# Altium footprint library XU-GENARAL PCB .PcbLib: 1176 footprints (part 50 of 75)
Each footprint in its own frame and in the unit in brackets; x right, y up, seen from the top. Pads: shape width x height; smd on the part's side, far side on the other; paste and mask are expansions set on the pad; w line width, h text height; cw(c..) or ccw(c..) is an arc to the next point about the centre after c.
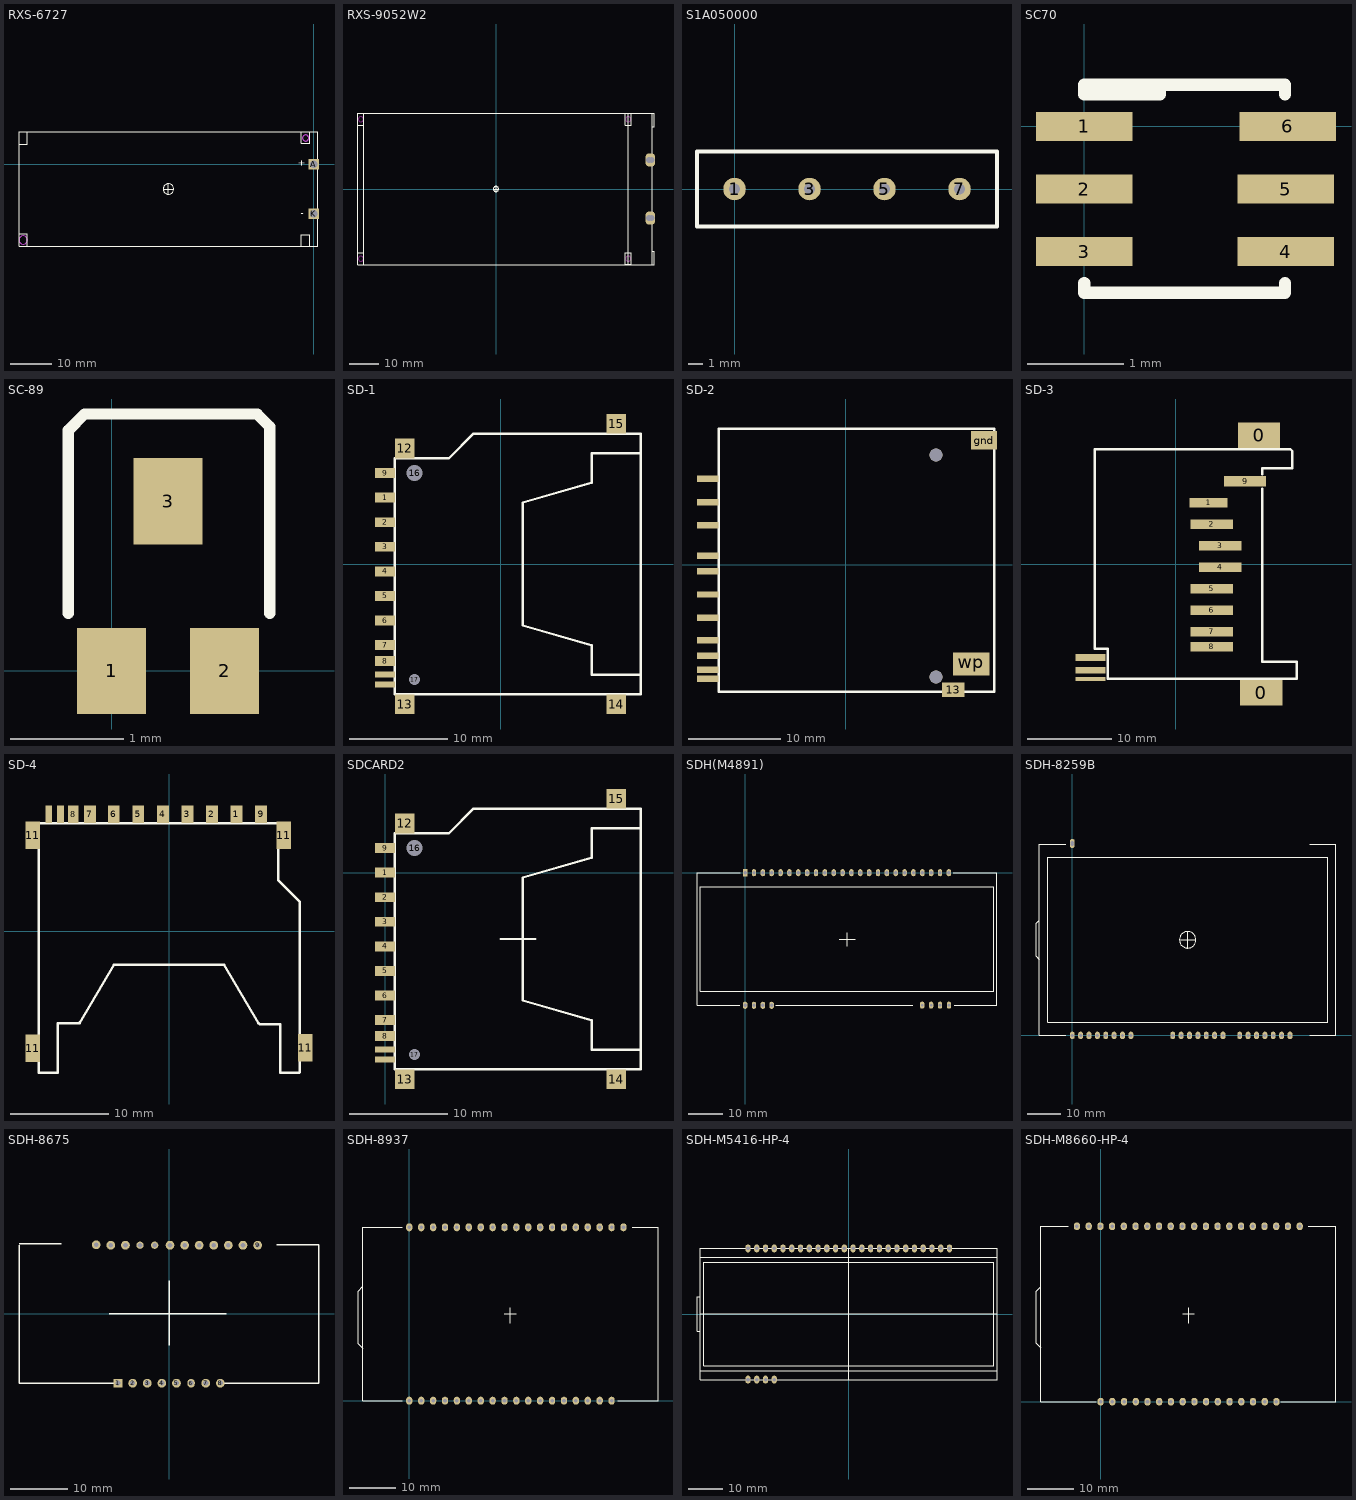
[diagram p49: the footprints below, top view; thin cyan lines are the x and y axes]

## RXS-6727 [mm]
pads (2):
  rect 2.5x2.5 hole 1.85: A(0,0) K(0,-12)
Top Overlay:
  circle w0.127: c-35.2,-6 r1.27
  lines w0.127: -71.4,-16.85 -69.4,-16.85 -69.4,-19.85 ; -71.4,4.85 -69.4,4.85 -69.4,7.85 ; -36.47,-6 -35.2,-6 ; -35.2,-7.27 -35.2,-6 ; -35.2,-4.73 -35.2,-6 ; -33.93,-6 -35.2,-6 ; -3,-19.85 -3,-17.05 -1,-17.05 -1,-19.85 ; -3,7.85 -3,5.05 -1,5.05 -1,7.85 ; -71.4,-19.85 -71.4,7.85 1,7.85 1,-19.85 -71.4,-19.85
  text "-" at -3.188,-12.604 h1.52
  text "+" at -2.172,-0.666 h1.52
Keep-Out Layer:
  circle w0.127: c-2,6.35 r0.75
  circle w0.127: c-70.4,-18.35 r1
Mechanical 1:
  circle w0.127: c-2,6.35 r0.75
  circle w0.127: c-70.4,-18.35 r1

## RXS-9052W2 [mm]
pads (4):
  oval 2.5x4.5 hole 2: A(52.7,-10) A(53.5,-10) K(52.7,10) K(53.5,10)
Top Overlay:
  circle w0.127: c0,0 r0.9
  lines w0.127: -47.5,-22 -45.5,-22 -45.5,-25.14 ; -47.5,22 -45.5,22 ; -45.5,22.86 -45.5,26 ; -1.016,0 0,0 ; 0,-1.016 0,0 ; 0,0.889 0,0 ; 1,0 0,0 ; 53.7,-21.4 54.5,-21.4 54.5,-26 53.7,-26 ; 53.7,21.4 54.5,21.4 54.5,26 53.7,26 ; -47.5,-26 -47.5,26 -45.5,26 ; -47.5,-26 -45.5,-26 ; -47.5,-26 -45.5,-26 ; -45.5,-26 -45.5,26 ; -45.5,-26 45.5,-26 ; -45.5,26 45.5,26 ; 45.5,-26 53.7,-26 ; 45.5,-26 45.5,26 ; 45.5,26 53.7,26 ; 53.7,-26 53.7,26 ; 44.484,-25.971 46.484,-25.971 46.484,-25.111 46.484,-21.971 44.484,-21.971 44.484,-25.971 ; 44.484,22 46.484,22 46.484,22.86 46.484,26 44.484,26 44.484,22
Keep-Out Layer:
  circle w0.1: c-46.5,24 r0.9
  circle w0.1: c-46.5,-24 r0.9
  circle w0.1: c45.5,24 r0.9
  circle w0.1: c45.5,-23.971 r0.9

## S1A050000 [mil]
pads (4):
  round 60 hole 30: 1(0,0) 3(200,0) 5(400,0) 7(600,0)
Top Overlay:
  lines w10: -100,-100 700,-100 700,100 -100,100 -100,-100

## SC70 [mm]
pads (6):
  rect 1x0.3 smd: 1(0,0) 2(0,-0.65) 3(0,-1.3) 4(2.092,-1.3) 5(2.092,-0.65) 6(2.112,0)
Top Overlay:
  lines w0.127: 0,-1.626 0,-1.727 2.083,-1.727 2.083,-1.626 ; 0.787,0.432 0.787,0.33 0,0.33 0,0.432 2.083,0.432 2.083,0.33

## SC-89 [mil]
pads (3):
  rect 24x30 smd: 1(0,0) 2(39.37,0) 3(19.68,59.05)
Top Overlay:
  lines w4: -15,20 -15,83.74 -9.37,89.37 50.63,89.37 55,85 55,20

## SD-1 [mm]
pads (17):
  rect 2x1 smd: 1(-11.75,6.75) 2(-11.75,4.25) 3(-11.75,1.75) 4(-11.75,-0.75) 5(-11.75,-3.25) 6(-11.75,-5.75) 7(-11.75,-8.25) 8(-11.75,-9.875) 9(-11.75,9.25)
  rect 2x0.6 smd: 10(-11.75,-12.25) 11(-11.75,-11.25)
  rect 2x2 smd: 12(-9.75,11.75) 13(-9.75,-14.25) 14(11.75,-14.25) 15(11.75,14.25)
  round 1.5 hole 1.6: 16(-8.75,9.25)
  round 1 hole 1.1: 17(-8.75,-11.75)
Top Overlay:
  lines w0.254: 14.25,-11.25 9.25,-11.25 9.25,-8.25 2.25,-6.25 2.25,6.25 9.25,8.25 9.25,11.25 14.25,11.25 ; -10.75,-13.25 -10.75,10.75 -5.25,10.75 -2.75,13.25 14.25,13.25 14.25,-13.25 -10.75,-13.25

## SD-2 [mm]
pads (14):
  rect 2.35x0.7 smd: 1(-14.935,6.8) 2(-14.935,4.3) 3(-14.935,1) 4(-14.935,-0.7) 5(-14.935,-3.2) 6(-14.935,-5.7) 7(-14.935,-8.13) 8(-14.935,-9.82) 9(-14.935,9.3) cd(-14.935,-11.32) com(-14.935,-12.32)
  rect 2.4x1.6 smd: 13(11.595,-13.5)
  rect 2.8x2 smd: gnd(14.935,13.5)
  rect 3.95x2.5 smd: wp(13.565,-10.7)
via 9.735,-12.1 diameter 1.4 hole 1.4
via 9.735,11.9 diameter 1.4 hole 1.4
Top Overlay:
  lines w0.254: -13.76,-13.72 -13.76,14.72 16.045,14.72 16.045,-13.72 -13.76,-13.72

## SD-3 [mm]
pads (14):
  rect 5x3 smd: 0(9.843,15.24) 0(10.097,-15.24)
  rect 4.5x1.143 smd: 1(3.874,7.239)
  rect 5x1.143 smd: 2(4.255,4.699) 3(5.271,2.159) 4(5.271,-0.381) 5(4.255,-2.921) 6(4.255,-5.461) 7(4.255,-8.001) 8(4.255,-9.779)
  rect 5x1.27 smd: 9(8.192,9.779)
  rect 3.556x0.8 smd: 10(-10.097,-11.049) 11(-10.097,-12.573)
  rect 3.556x0.5 smd: 12(-10.097,-13.589)
Top Overlay:
  lines w0.3: 7.683,-13.589 14.287,-13.589 14.287,-11.557 10.223,-11.557 10.223,8.889 ; 8.191,-13.589 -8.065,-13.589 -8.065,-10.033 -9.589,-10.033 -9.589,13.589 8.191,13.589 13.525,13.589 13.779,13.335 13.779,11.303 10.223,11.303 10.223,10.59

## SD-4 [mm]
pads (15):
  rect 1.2x1.8 smd: 1(6.858,11.917) 2(4.369,11.917) 3(1.875,11.908) 4(-0.625,11.908) 5(-3.125,11.908) 6(-5.625,11.908) 7(-8.05,11.908) 9(9.375,11.908)
  rect 1.1x1.8 smd: 8(-9.754,11.917)
  rect 0.7x1.8 smd: 10(-11.05,11.908) 12(-12.243,11.917)
  rect 1.5x2.8 smd: 11(-13.868,-11.917) 11(-13.868,9.774) 11(11.684,9.774) 11(13.868,-11.866)
Top Overlay:
  lines w0.254: -11.3,-9.383 -11.3,-14.383 -13.273,-14.383 -13.273,11.003 -13.259,11.017 11.1,11.017 11.1,5.207 13.289,3.018 13.3,3.018 13.3,-14.356 13.273,-14.383 11.3,-14.383 11.3,-9.484 9.258,-9.484 9.1,-9.326 ; -11.249,-9.377 -9.207,-9.377 -9.049,-9.219 ; -9.1,-9.377 -5.588,-3.383 ; -5.6,-3.383 5.6,-3.383 9.1,-9.377
Multi-Layer:
  circle w0.254: c-11.532,8.617 r0.58
  circle w0.254: c9.5,8.657 r0.82

## SDCARD2 [mm]
height 1.1
pads (17):
  rect 2x1 smd: 1(0,0) 2(0,-2.5) 3(0,-5) 4(0,-7.5) 5(0,-10) 6(0,-12.5) 7(0,-15) 8(0,-16.625) 9(0,2.5)
  rect 2x0.6 smd: 10(0,-19) 11(0,-18)
  rect 2x2 smd: 12(2,5) 13(2,-21) 14(23.5,-21) 15(23.5,7.5)
  round 1.5 hole 1.6: 16(3,2.5)
  round 1 hole 1.1: 17(3,-18.5)
Top Overlay:
  lines w0.2: 11.75,-6.75 15.306,-6.75
  lines w0.254: 26,-18 21,-18 21,-15 14,-13 14,-0.5 21,1.5 21,4.5 26,4.5 ; 1,-20 26,-20 26,6.5 9,6.5 6.5,4 1,4 1,-20

## SDH(M4891) [mil]
pads (32):
  rect 50x80 hole 38: 1(0,0)
  oval 50x80 hole 38: 2(100,0) 3(200,0) 4(300,0) 5(400,0) 6(500,0) 7(600,0) 8(700,0) 9(800,0) 10(900,0) 11(1000,0) 12(1100,0) 13(1200,0) 14(1300,0) 15(1400,0) 16(1500,0) 17(1600,0) 18(1700,0) 19(1800,0) 20(1900,0) 21(2000,0) 22(2100,0) 23(2200,0) 24(2300,0) 25(0,-1496) 26(100,-1496.06) 27(200,-1496.06) 28(300,-1496.06)
  oval 50x80 hole 30: 29(1998,-1495.03) 30(2099,-1495.03) 31(2200,-1495) 32(2301,-1495.03)
Top Overlay:
  lines w5: -59.06,-1496.06 -59,-1496 ; 4,-1339 4.42,-1338.58 ; 1065,-748.03 1150,-748.03 ; 1135,-748.03 1244,-748.03 ; 1150,-831.03 1150,-748.03 ; 1150,-676.03 1150,-748.03
  lines w10: -59.06,-1496.06 -542.91,-1496.06 -542.91,0 -53,0 ; 345.94,-1496.06 1889.76,-1496.06 ; 2347,0 2842.91,0 2842.91,-1496.06 2362.2,-1496.06 ; -503.54,-1338.58 -503.54,-157.48 2803.54,-157.48 2803.54,-1338.58 -503.54,-1338.58

## SDH-8259B [mil]
pads (26):
  oval 59.06x90 hole 40: 19(0,0) 20(100,0) 21(200,0) 22(300,0) 23(400,0) 24(500,0) 25(600,0) 26(700,0) 27(1200,0) 27(1200,0) 28(1300,0) 29(1400,0) 30(1500,0) 31(1600,0) 32(1700,0) 33(1800,0) 34(2000,0) 34(2000,0) 35(2100,0) 36(2200,0) 37(2300,0) 38(2400,0) 39(2500,0) 40(2600,0)
  oval 59.05x90 hole 40: 72(0,2283.47) 72(0,2303.15)
Top Overlay:
  circle w10: c1377.95,1141.73 r98.42
  lines w8: -393.7,905.51 -433.07,944.88 -433.07,1141.73 -433.07,1338.58 -393.7,1377.95 ; -78.74,0 -393.7,0 -393.7,2283.47 -78.74,2283.47 ; 1279.53,1141.73 1476.38,1141.73 ; 1377.95,1043.31 1377.95,1240.16 ; 2834.65,0 3149.61,0 3149.61,2283.47 2834.65,2283.47 ; -295.28,157.48 3051.18,157.48 3051.18,2125.98 -295.28,2125.98 -295.28,157.48

## SDH-8675 [mil]
pads (20):
  rect 60x60 hole 35: 1(-350.41,-475)
  round 60 hole 35: 2(-250.41,-475) 3(-150.41,-475) 4(-50.41,-475) 5(49.59,-475) 7(249.59,-475) 8(349.59,-475)
  oval 50x60 hole 35: 6(149.59,-475)
  round 60 hole 32: 9(604.41,468.28) 10(504.41,468.28) 11(404.41,468.28) 12(304.41,468.28) 13(204.41,468.28) 14(105.23,468.57) 15(5.23,468.57) 18(-299.59,468.57) 19(-399.59,468.57) 20(-499.59,471.29)
  round 50 hole 32: 16(-99.59,468.57) 17(-199.59,468.57)
Top Overlay:
  lines w10: -1027.37,-473.72 -1027.37,468.28 ; -1027.25,478.28 -737.59,478.28 ; -1026.09,-475 -350.41,-475 ; -410.41,-1.36 389.59,-1.36 ; -0.41,-215 -0.41,225 ; 349.59,-475 1022.91,-475 ; 736.41,470.28 1024.19,470.28 1024.19,-473.72

## SDH-8937 [mm]
pads (37):
  oval 1.35x1.7 hole 0.762: 1(0,0) 2(2.54,0) 3(5.08,0) 4(7.62,0) 5(10.16,0) 6(12.7,0) 7(15.24,0) 8(17.78,0) 9(20.32,0) 10(22.86,0) 11(25.4,0) 12(27.94,0) 13(30.48,0) 14(33.02,0) 15(35.56,0) 16(38.1,0) 17(40.64,0) 18(43.18,0) 19(45.72,37) 20(43.18,37) 21(40.64,37) 22(38.1,37) 23(35.56,37) 24(33.02,37) 25(30.48,37) 26(27.94,37) 27(25.4,37) 28(22.86,37) 29(20.32,37) 30(17.78,37) 31(15.24,37) 32(12.7,37) 33(10.16,37) 34(7.62,37) 35(5.08,37) 36(2.54,37) 37(0,37)
Top Overlay:
  lines w0.203: -9.952,11.2 -10.952,12.2 -10.952,23.376 -9.952,24.376 ; -1.46,0 -9.91,0 -9.91,37 -1.46,37 ; 20.32,18.5 22.86,18.5 ; 21.59,16.543 21.59,18.5 21.59,19.845 ; 44.54,0 53.09,0 53.09,37 47.54,37

## SDH-M5416-HP-4 [mil]
pads (28):
  oval 60x90 hole 40: 1(-1150.09,748.06) 2(-1050.09,748.06) 3(-950.09,748.06) 4(-850.09,748.06) 5(-750.09,748.06) 6(-650.09,748.06) 7(-550.09,748.06) 8(-450.09,748.06) 9(-350.09,748.06) 10(-250.09,748.06) 11(-150.09,748.06) 12(-50.09,748.06) 13(49.91,748.06) 14(149.91,748.06) 15(249.91,748.06) 16(349.91,748.06) 17(449.91,748.06) 18(549.91,748.06) 19(649.91,748.06) 20(749.91,748.06) 21(849.91,748.06) 22(949.91,748.06) 23(1049.91,748.06) 24(1149.91,748.06) 25(-1150.09,-748) 26(-1050.09,-747.92) 27(-950.09,-747.92) 28(-850.09,-747.92)
Top Overlay:
  lines w5: -1693,-196.82 -1732.37,-196.82 -1732.37,196.88 -1693,196.88 ; -1653.63,-590.52 1653.46,-590.52 1653.46,590.58 -1653.63,590.58 -1653.63,-590.52
  lines w10: -1693,-649.58 1692.83,-649.58 ; -1693,0.03 1692.83,0.03 ; -1693,649.64 1692.83,649.64 ; -0.09,-748 -0.09,748.06 ; -1693,-748 1692.83,-748 1692.83,748.06 -1693,748.06 -1693,-748

## SDH-M8660-HP-4 [mm]
pads (37):
  oval 1.35x1.7 hole 0.762: 1(0,0) 2(2.54,0) 3(5.08,0) 4(7.62,0) 5(10.16,0) 6(12.7,0) 7(15.24,0) 8(17.78,0) 9(20.32,0) 10(22.86,0) 11(25.4,0) 12(27.94,0) 13(30.48,0) 14(33.02,0) 15(35.56,0) 16(38.1,0) 17(43.13,38) 17(43.13,38) 18(40.59,38) 19(38.05,38) 20(35.51,38) 21(32.97,38) 22(30.43,38) 23(27.89,38) 24(25.35,38) 25(22.81,38) 26(20.27,38) 27(17.73,38) 28(15.19,38) 29(12.65,38) 30(10.11,38) 31(7.57,38) 32(5.03,38) 33(2.49,38) 34(-0.05,38) 35(-2.59,38) 36(-5.13,38)
Top Overlay:
  lines w0.203: -13,11.7 -14,12.7 -14,23.876 -13,24.876 ; -7,38 -13,38 -13,0 -1,0 ; 17.78,19 20.32,19 ; 19.05,17.043 19.05,19 19.05,20.345 ; 39,0 51,0 51,38 45,38